# Altium footprint library pcb_ConnectorGeneral.PcbLib: 111 footprints (part 3 of 7)
Each footprint in its own frame and in the unit in brackets; x right, y up, seen from the top. Pads: shape width x height; smd on the part's side, far side on the other; paste and mask are expansions set on the pad; w line width, h text height; cw(c..) or ccw(c..) is an arc to the next point about the centre after c.
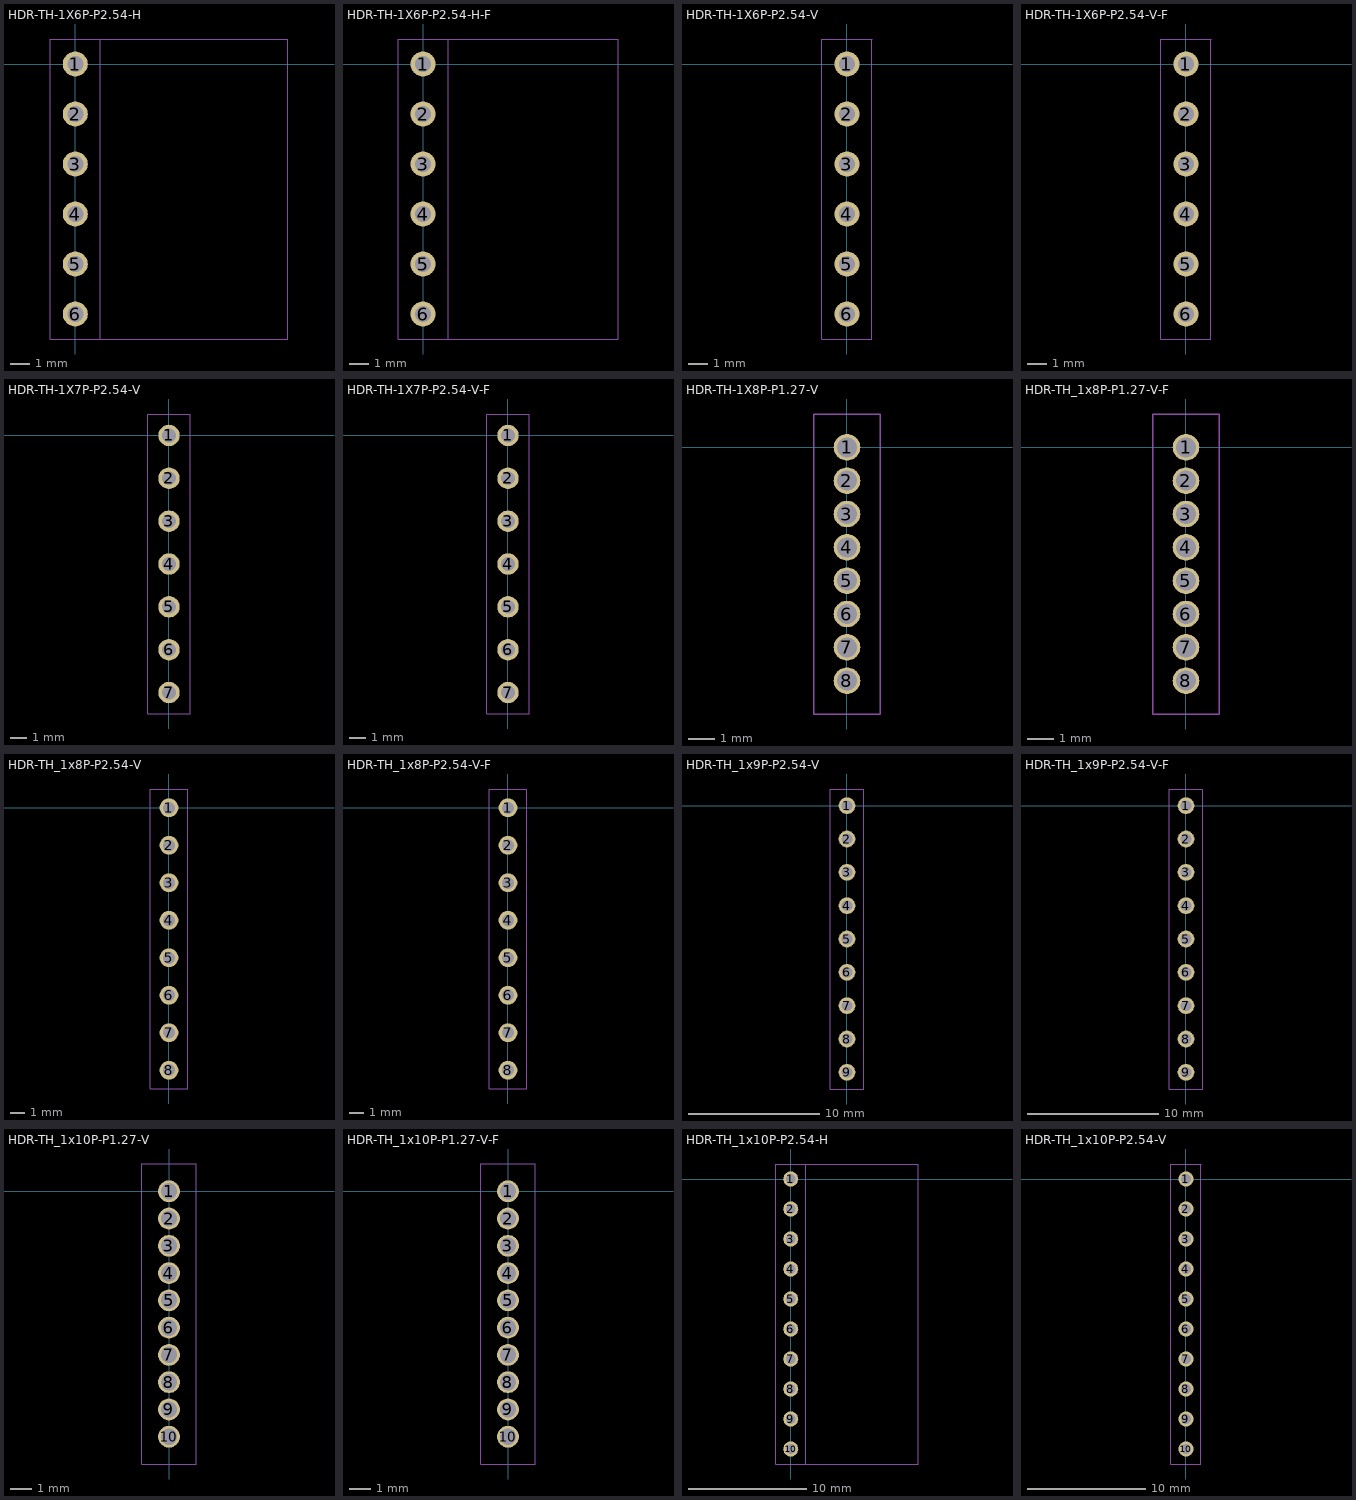
[diagram p2: the footprints below, top view; thin cyan lines are the x and y axes]

## HDR-TH-1X6P-P2.54-H [mil]
height 169.29
pads (6):
  round 50 hole 32: 1(0,0) 2(0,-100) 3(0,-200) 4(0,-300) 5(0,-400) 6(0,-500)
Mechanical 13:
  lines w2: -50,-550 -50,50 425,50 425,-550 -50,-550
Mechanical 14:
  lines w2: -50,-550 -50,50 50,50 50,-550 -50,-550
Mechanical 16:
  text ".Designator" at 0,0 h39.37
3D body "pin_header_aw140-ea-g06g.stp": height 99.21, standoff -93.7, extent -14.96,-546.06 423.63,46.06

## HDR-TH-1X6P-P2.54-H-F [mil]
height 169.29
pads (6):
  round 50 hole 32: 1(0,0) 2(0,-100) 3(0,-200) 4(0,-300) 5(0,-400) 6(0,-500)
Mechanical 13:
  lines w2: -50,-550 390,-550 390,50 -50,50 -50,-550
Mechanical 14:
  lines w2: -50,-550 -50,50 50,50 50,-550 -50,-550
Mechanical 16:
  text ".Designator" at 0,0 h39.37
3D body "female_header_a-bl254-ea-g06d.stp": height 99.21, standoff -125.2, extent -10,-554.92 386.06,54.92

## HDR-TH-1X6P-P2.54-V [mil]
height 169.29
pads (6):
  round 50 hole 32: 1(0,0) 2(0,-100) 3(0,-200) 4(0,-300) 5(0,-400) 6(0,-500)
Mechanical 13:
  lines w2: -50,-550 50,-550 50,50 -50,50 -50,-550
Mechanical 14:
  lines w2: -50,-550 50,-550 50,50 -50,50 -50,-550
Mechanical 16:
  text ".Designator" at 0,0 h39.37
3D body "pin_header_aw140-eg-g06d.stp": height 322.83, standoff -118.11, extent -49.19,-549.99 49.18,50

## HDR-TH-1X6P-P2.54-V-F [mil]
height 169.29
pads (6):
  round 50 hole 32: 1(0,0) 2(0,-100) 3(0,-200) 4(0,-300) 5(0,-400) 6(0,-500)
Mechanical 13:
  lines w2: -50,-550 -50,50 50,50 50,-550 -50,-550
Mechanical 14:
  lines w2: -50,-550 50,-550 50,50 -50,50 -50,-550
Mechanical 16:
  text ".Designator" at 0,0 h39.37
3D body "female_header_a-bl254-eg-g06d.stp": height 334.65, standoff -125.98, extent -49.22,-554.84 49.21,55

## HDR-TH-1X7P-P2.54-V [mil]
height 169.29
pads (7):
  round 50 hole 32: 1(0,0) 2(0,-100) 3(0,-200) 4(0,-300) 5(0,-400) 6(0,-500) 7(0,-600)
Mechanical 13:
  lines w2: -50,-650 -50,50 50,50 50,-650 -50,-650
Mechanical 14:
  lines w2: -50,-650 -50,50 50,50 50,-650 -50,-650
Mechanical 16:
  text ".Designator" at 0,0 h39.37
3D body "pin_header_aw140-eg-g07d.stp": height 322.83, standoff -118.11, extent -49.18,-650 49.18,50

## HDR-TH-1X7P-P2.54-V-F [mil]
height 169.29
pads (7):
  round 50 hole 32: 1(0,0) 2(0,-100) 3(0,-200) 4(0,-300) 5(0,-400) 6(0,-500) 7(0,-600)
Mechanical 13:
  lines w2: -50,-650 -50,50 50,50 50,-650 -50,-650
Mechanical 14:
  lines w2: -50,-650 -50,50 50,50 50,-650 -50,-650
Mechanical 16:
  text ".Designator" at 0,0 h39.37
3D body "female_header_a-bl254-eg-g07d.stp": height 334.65, standoff -125.98, extent -49.21,-654.92 49.21,54.92

## HDR-TH-1X8P-P1.27-V [mil]
height 169.29
pads (8):
  round 40 hole 30: 1(0,0) 2(0,-50) 3(0,-100) 4(0,-150) 5(0,-200) 6(0,-250) 7(0,-300) 8(0,-350)
Mechanical 13:
  lines w2: -50,-400 -50,50 50,50 50,-400 -50,-400
Mechanical 14:
  lines w2: -50,-400 -50,50 50,50 50,-400 -50,-400
Mechanical 16:
  text ".Designator" at 0,0 h39.37
3D body "pin_header_a-sl127-eg-z08d.stp": height 210.24, standoff -102.36, extent -49.21,-375 49.22,25

## HDR-TH_1x8P-P1.27-V-F [mil]
height 169.29
pads (8):
  round 40 hole 30: 1(0,0) 2(0,-50) 3(0,-100) 4(0,-150) 5(0,-200) 6(0,-250) 7(0,-300) 8(0,-350)
Mechanical 13:
  lines w2: -50,-400 -50,50 50,50 50,-400 -50,-400
Mechanical 14:
  lines w2: -50,-400 -50,50 50,50 50,-400 -50,-400
Mechanical 16:
  text ".Designator" at 0,0 h39.37
3D body "female_header_a-bl127-eg-z08d.stp": height 133.86, standoff -94.49, extent -35.44,-382.88 35.43,32.87

## HDR-TH_1x8P-P2.54-V [mil]
height 169.29
pads (8):
  round 50 hole 32: 1(0,0) 2(0,-100) 3(0,-200) 4(0,-300) 5(0,-400) 6(0,-500) 7(0,-600) 8(0,-700)
Mechanical 13:
  lines w2: -50,-750 50,-750 50,50 -50,50 -50,-750
Mechanical 14:
  lines w2: -50,-750 -50,50 50,50 50,-750 -50,-750
Mechanical 16:
  text ".Designator" at 0,0 h39.37
3D body "pin_header_aw140-eg-g08d.stp": height 322.83, standoff -118.11, extent -49.18,-750 49.18,50

## HDR-TH_1x8P-P2.54-V-F [mil]
height 169.29
pads (8):
  round 50 hole 32: 1(0,0) 2(0,-100) 3(0,-200) 4(0,-300) 5(0,-400) 6(0,-500) 7(0,-600) 8(0,-700)
Mechanical 13:
  lines w2: -50,-750 -50,50 50,50 50,-750 -50,-750
Mechanical 14:
  lines w2: -50,-750 -50,50 50,50 50,-750 -50,-750
Mechanical 16:
  text ".Designator" at 0,0 h39.37
3D body "female_header_a-bl254-eg-g08d.stp": height 334.65, standoff -125.98, extent -49.22,-754.85 49.21,55

## HDR-TH_1x9P-P2.54-V [mil]
height 169.29
pads (9):
  round 50 hole 32: 1(0,0) 2(0,-100) 3(0,-200) 4(0,-300) 5(0,-400) 6(0,-500) 7(0,-600) 8(0,-700) 9(0,-800)
Mechanical 13:
  lines w2: -50,-850 50,-850 50,50 -50,50 -50,-850
Mechanical 14:
  lines w2: -50,-850 -50,50 50,50 50,-850 -50,-850
Mechanical 16:
  text ".Designator" at 0,0 h39.37
3D body "pin_header_aw140-eg-g09d.stp": height 322.83, standoff -118.11, extent -49.18,-850 49.18,50

## HDR-TH_1x9P-P2.54-V-F [mil]
height 169.29
pads (9):
  round 50 hole 32: 1(0,0) 2(0,-100) 3(0,-200) 4(0,-300) 5(0,-400) 6(0,-500) 7(0,-600) 8(0,-700) 9(0,-800)
Mechanical 13:
  lines w2: -50,-850 50,-850 50,50 -50,50 -50,-850
Mechanical 14:
  lines w2: -50,-850 -50,50 50,50 50,-850 -50,-850
Mechanical 16:
  text ".Designator" at 0,0 h39.37
3D body "female_header_a-bl254-eg-g09d.stp": height 334.65, standoff -125.98, extent -49.21,-854.92 49.22,54.92

## HDR-TH_1x10P-P1.27-V [mil]
height 169.29
pads (10):
  round 40 hole 30: 1(0,0) 2(0,-50) 3(0,-100) 4(0,-150) 5(0,-200) 6(0,-250) 7(0,-300) 8(0,-350) 9(0,-400) 10(0,-450)
Mechanical 13:
  lines w2: -50,-500 50,-500 50,50 -50,50 -50,-500
Mechanical 14:
  lines w2: -50,-500 50,-500 50,50 -50,50 -50,-500
Mechanical 16:
  text ".Designator" at 0,0 h39.37
3D body "pin_header_a-sl127-eg-g10d.stp": height 210.24, standoff -102.36, extent -49.21,-475 49.22,25

## HDR-TH_1x10P-P1.27-V-F [mil]
height 169.29
pads (10):
  round 40 hole 30: 1(0,0) 2(0,-50) 3(0,-100) 4(0,-150) 5(0,-200) 6(0,-250) 7(0,-300) 8(0,-350) 9(0,-400) 10(0,-450)
Mechanical 13:
  lines w2: -50,-500 -50,50 50,50 50,-500 -50,-500
Mechanical 14:
  lines w2: -50,-500 -50,50 50,50 50,-500 -50,-500
Mechanical 16:
  text ".Designator" at 0,0 h39.37
3D body "female_header_a-bl127-eg-g10d.stp": height 133.86, standoff -94.49, extent -35.43,-482.87 35.44,32.88

## HDR-TH_1x10P-P2.54-H [mil]
height 169.29
pads (10):
  round 50 hole 32: 1(0,0) 2(0,-100) 3(0,-200) 4(0,-300) 5(0,-400) 6(0,-500) 7(0,-600) 8(0,-700) 9(0,-800) 10(0,-900)
Mechanical 13:
  lines w2: -50,-950 425,-950 425,50 -50,50 -50,-950
Mechanical 14:
  lines w2: -50,-950 50,-950 50,50 -50,50 -50,-950
Mechanical 16:
  text ".Designator" at 0,0 h39.37
3D body "pin_header_aw140-ea-g10g.stp": height 99.21, standoff -93.7, extent -15,-946.06 423.59,46.06

## HDR-TH_1x10P-P2.54-V [mil]
height 169.29
pads (10):
  round 50 hole 32: 1(0,0) 2(0,-100) 3(0,-200) 4(0,-300) 5(0,-400) 6(0,-500) 7(0,-600) 8(0,-700) 9(0,-800) 10(0,-900)
Mechanical 13:
  lines w2: -50,-950 -50,50 50,50 50,-950 -50,-950
Mechanical 14:
  lines w2: -50,-950 50,-950 50,50 -50,50 -50,-950
Mechanical 16:
  text ".Designator" at 0,0 h39.37
3D body "pin_header_aw140-eg-g10d.stp": height 322.83, standoff -118.11, extent -49.18,-950 49.18,50